# Altium footprint library TSC Footprints.PcbLib: 99 footprints (part 5 of 7)
Each footprint in its own frame and in the unit in brackets; x right, y up, seen from the top. Pads: shape width x height; smd on the part's side, far side on the other; paste and mask are expansions set on the pad; w line width, h text height; cw(c..) or ccw(c..) is an arc to the next point about the centre after c.
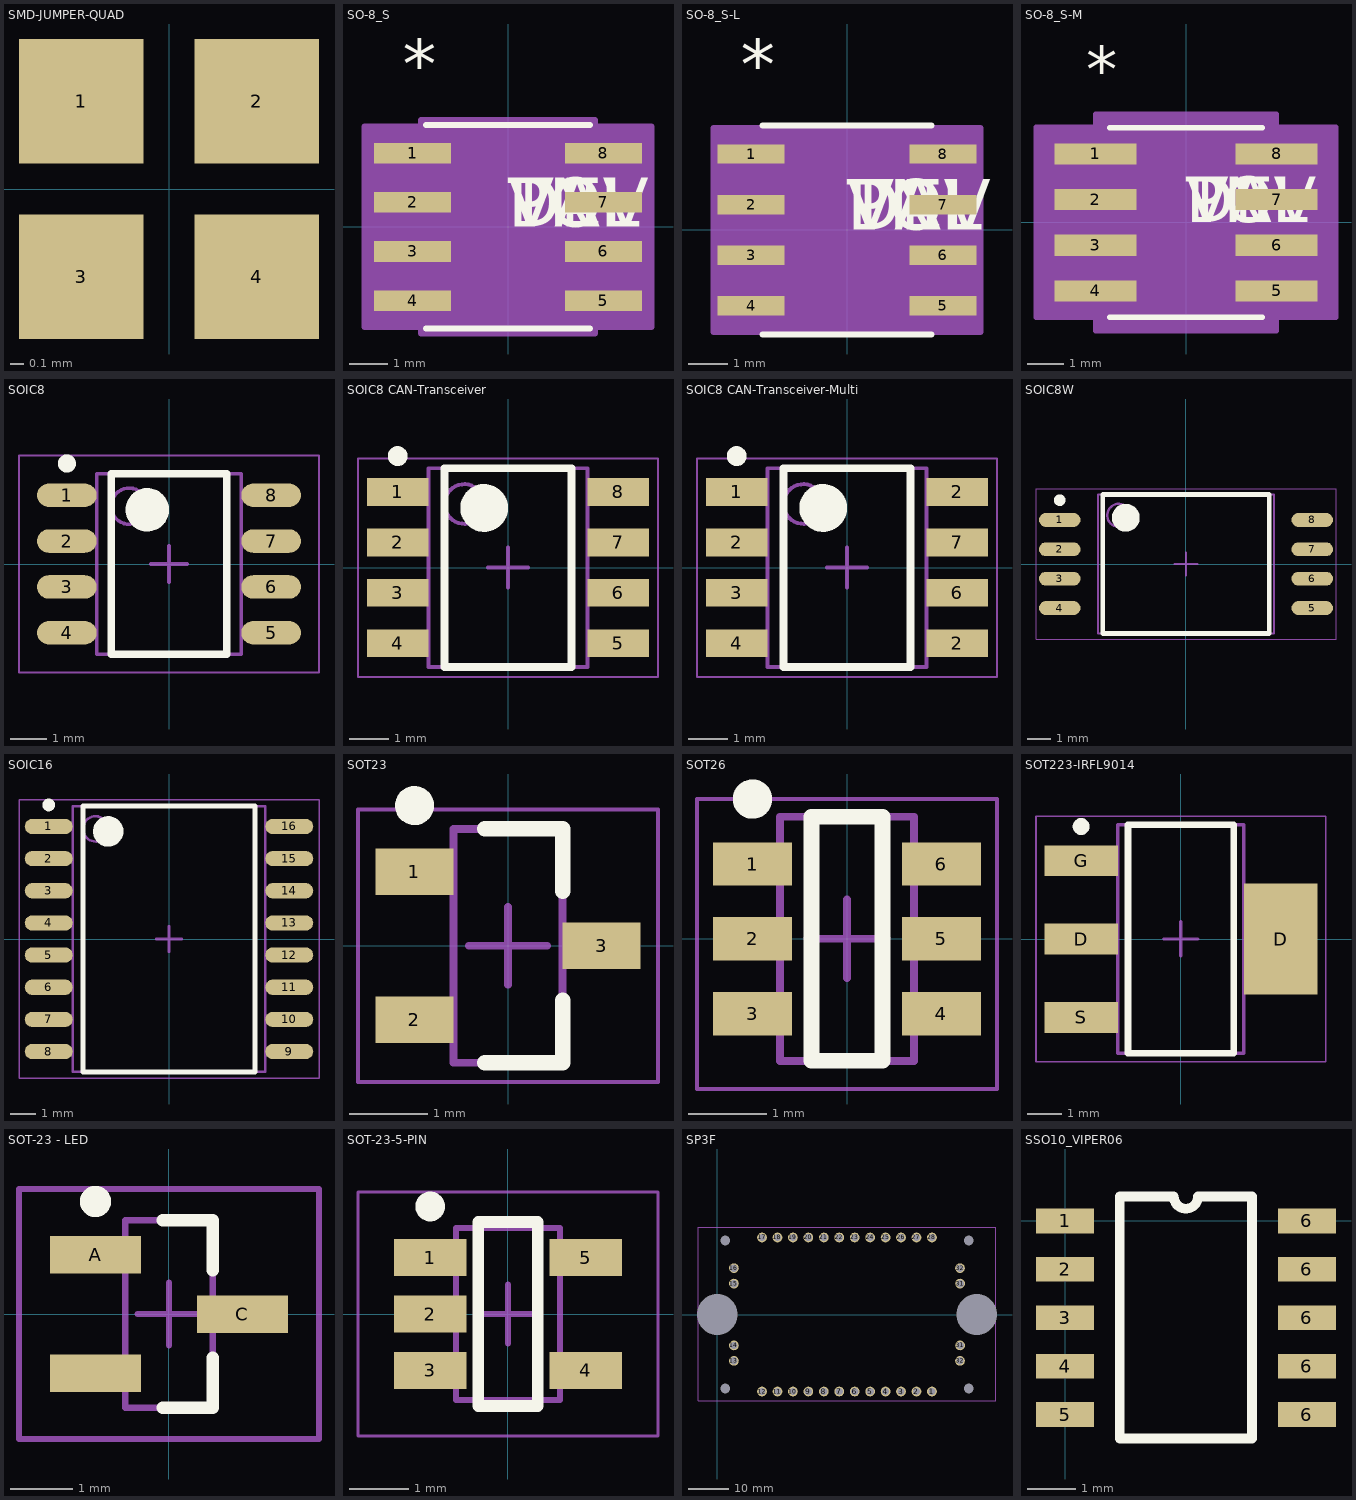
[diagram p4: the footprints below, top view; thin cyan lines are the x and y axes]

## SMD-JUMPER-QUAD [mm] "Jumper, SMD"
pads (4):
  rect 0.9x0.9 smd: 1(-0.635,0.635) 2(0.635,0.635) 3(-0.635,-0.635) 4(0.635,-0.635)

## SO-8_S [mil]
pads (8):
  rect 78x21 smd: 1(-97,75) 2(-97,25) 3(-97,-25) 4(-97,-75) 5(97,-75) 6(97,-25) 7(97,25) 8(97,75)
Top Overlay:
  lines w6: -83.5,-103.5 83.5,-103.5 ; -83.5,103.5 83.5,103.5
  text "TOL" at 0,0 h50
  text "VAL" at 0,0 h50
  text "DEV" at 0,0 h50
  text "PN" at 0,0 h50
  text "*" at -107,141 h50
Mechanical 13:
  lines w0: -12,98.5 ccw(c0,98.5) 12,98.5
  text "RefDes2" at 0,0 h50
  text "*" at -63.5,95.5 h50
Mechanical 15:
  region: -88.5,-102 -146,-102 -146,102 -88.5,102 -88.5,108.5 88.5,108.5 88.5,102 146,102 146,-102 88.5,-102 88.5,-108.5 -88.5,-108.5
  lines w6: -146,-102 -88.5,-102 -88.5,-108.5 88.5,-108.5 88.5,-102 146,-102 146,102 88.5,102 88.5,108.5 -88.5,108.5 -88.5,102 -146,102 -146,-102
3D body: height 10, standoff 0, extent 0,0 10,10
3D body "SO-8_S.step": height 69.09, standoff 0, extent -122.01,-98.51 122,98.5

## SO-8_S-L [mil]
pads (8):
  rect 66x19 smd: 1(-95,75) 2(-95,25) 3(-95,-25) 4(-95,-75) 5(95,-75) 6(95,-25) 7(95,25) 8(95,75)
Top Overlay:
  lines w6: -83.5,-103.5 83.5,-103.5 ; -83.5,103.5 83.5,103.5
  text "*" at -105,139 h50
  text "PN" at 0,0 h50
  text "DEV" at 0,0 h50
  text "VAL" at 0,0 h50
  text "TOL" at 0,0 h50
Mechanical 13:
  lines w0: -12,98.5 ccw(c0,98.5) 12,98.5
  text "*" at -63.5,95.5 h50
  text "RefDes2" at 0,0 h50
Mechanical 15:
  region: -82.5,-100.8 -132,-100.8 -132,100.8 -82.5,100.8 -82.5,102.5 82.5,102.5 82.5,100.8 132,100.8 132,-100.8 82.5,-100.8 82.5,-102.5 -82.5,-102.5
  lines w6: -132,-100.8 -132,100.8 -82.5,100.8 -82.5,102.5 82.5,102.5 82.5,100.8 132,100.8 132,-100.8 82.5,-100.8 82.5,-102.5 -82.5,-102.5 -82.5,-100.8 -132,-100.8
3D body: height 10, standoff 0, extent 0,0 10,10
3D body "SO-8_S-L.step": height 69.09, standoff 0, extent -122.01,-98.51 122,98.5

## SO-8_S-M [mil]
pads (8):
  rect 90x23 smd: 1(-99,75) 2(-99,25) 3(-99,-25) 4(-99,-75) 5(99,-75) 6(99,-25) 7(99,25) 8(99,75)
Top Overlay:
  lines w6: -83.5,-103.5 83.5,-103.5 ; -83.5,103.5 83.5,103.5
  text "*" at -109,143 h50
  text "PN" at 0,0 h50
  text "DEV" at 0,0 h50
  text "VAL" at 0,0 h50
  text "TOL" at 0,0 h50
Mechanical 13:
  lines w0: -12,98.5 ccw(c0,98.5) 12,98.5
  text "*" at -63.5,95.5 h50
  text "RefDes2" at 0,0 h50
Mechanical 15:
  region: -98.5,-104 -164,-104 -164,104 -98.5,104 -98.5,118.5 98.5,118.5 98.5,104 164,104 164,-104 98.5,-104 98.5,-118.5 -98.5,-118.5
  lines w6: -164,-104 -164,104 -98.5,104 -98.5,118.5 98.5,118.5 98.5,104 164,104 164,-104 98.5,-104 98.5,-118.5 -98.5,-118.5 -98.5,-104 -164,-104
3D body: height 10, standoff 0, extent 0,0 10,10
3D body "SO-8_S-M.step": height 69.09, standoff 0, extent -122.01,-98.51 122,98.5

## SOIC8 [mm] "SOIC, 8-Leads, Body 4,90x3,90mm, Pitch 1,27mm, IPC Low Density"
height 1.75
pads (8):
  oval 1.65x0.65 smd: 1(-2.825,1.905) 2(-2.825,0.635) 3(-2.825,-0.635) 4(-2.825,-1.905) 5(2.825,-1.905) 6(2.825,-0.635) 7(2.825,0.635) 8(2.825,1.905)
Top Overlay:
  circle w0.25: c-2.825,2.78 r0.125
  circle w0.6: c-0.6,1.5 r0.3
  lines w0.2: -1.6,-2.5 -1.6,2.5 1.6,2.5 1.6,-2.5 -1.6,-2.5
Mechanical 13:
  circle w0.1: c-1.1,1.6 r0.5
  lines w0.1: -2,-2.5 -2,2.5 2,2.5 2,-2.5 -2,-2.5
Mechanical 15:
  lines w0.05: -4.15,-3 -4.15,3 4.15,3 4.15,-3 -4.15,-3
  lines w0.1: -0.5,0 0.5,0 ; 0,-0.5 0,0.5
3D body "SOIC8.step": height 1.75, standoff 0, extent -3,-2.5 3,2.5

## SOIC8 CAN-Transceiver [mm] "SOIC, 8-Leads, Body 4,90x4,00mm, Pitch 1,27mm, IPC Medium Density"
height 1.75
pads (8):
  rect 1.55x0.7 smd: 1(-2.775,1.905) 2(-2.775,0.635) 3(-2.775,-0.635) 4(-2.775,-1.905) 5(2.775,-1.905) 6(2.775,-0.635) 7(2.775,0.635) 8(2.775,1.905)
Top Overlay:
  circle w0.25: c-2.775,2.805 r0.125
  circle w0.6: c-0.6,1.5 r0.3
  lines w0.2: -1.6,-2.5 -1.6,2.5 1.6,2.5 1.6,-2.5 -1.6,-2.5
Mechanical 13:
  circle w0.1: c-1.1,1.6 r0.5
  lines w0.1: -2,-2.5 -2,2.5 2,2.5 2,-2.5 -2,-2.5
Mechanical 15:
  lines w0.05: -3.775,-2.75 -3.775,2.75 3.775,2.75 3.775,-2.75 -3.775,-2.75
  lines w0.1: -0.5,0 0.5,0 ; 0,-0.5 0,0.5
3D body "SOIC8 CAN-Transciever.step": height 1.75, standoff 0, extent -3.1,-2.5 3.1,2.5

## SOIC8 CAN-Transceiver-Multi [mm] "SOIC, 8-Leads, Body 4,90x4,00mm, Pitch 1,27mm, IPC Medium Density"
height 1.75
pads (8):
  rect 1.55x0.7 smd: 1(-2.775,1.905) 2(-2.775,0.635) 2(2.775,-1.905) 2(2.775,1.905) 3(-2.775,-0.635) 4(-2.775,-1.905) 6(2.775,-0.635) 7(2.775,0.635)
Top Overlay:
  circle w0.6: c-0.6,1.5 r0.3
  circle w0.25: c-2.775,2.805 r0.125
  lines w0.2: -1.6,-2.5 1.6,-2.5 1.6,2.5 -1.6,2.5 -1.6,-2.5
Mechanical 13:
  circle w0.1: c-1.1,1.6 r0.5
  lines w0.1: -2,-2.5 2,-2.5 2,2.5 -2,2.5 -2,-2.5
Mechanical 15:
  lines w0.05: -3.775,-2.75 3.775,-2.75 3.775,2.75 -3.775,2.75 -3.775,-2.75
  lines w0.1: -0.5,0 0.5,0 ; 0,-0.5 0,0.5
3D body "SOIC8 CAN-Transciever.step": height 1.75, standoff 0, extent -3.1,-2.5 3.1,2.5

## SOIC8W [mm] "SOIC, 8-Leads, Body 5,85mm x 7,50mm, Pitch 1,27mm, IPC Medium Density"
height 2.8
pads (8):
  oval 1.8x0.6 smd: 1(-5.45,1.905) 2(-5.45,0.635) 3(-5.45,-0.635) 4(-5.45,-1.905) 5(5.45,-1.905) 6(5.45,-0.635) 7(5.45,0.635) 8(5.45,1.905)
Top Overlay:
  circle w0.6: c-2.6,2 r0.3
  circle w0.25: c-5.45,2.755 r0.125
  lines w0.2: -3.6,-3 3.6,-3 3.6,3 -3.6,3 -3.6,-3
Mechanical 13:
  circle w0.1: c-2.9,2.1 r0.5
  lines w0.1: -3.8,-3 3.8,-3 3.8,3 -3.8,3 -3.8,-3
Mechanical 15:
  lines w0.05: -6.475,-3.25 6.475,-3.25 6.475,3.25 -6.475,3.25 -6.475,-3.25
  lines w0.1: -0.5,0 0.5,0 ; 0,-0.5 0,0.5
3D body "SOIC8W.step": height 2.8, standoff 0, extent -5.75,-3 5.75,3

## SOIC16 [mm] "SOIC, 16-Leads, Body 10,30x7,50mm, Pitch 1,27mm, IPC Medium Density"
height 2.65
pads (16):
  oval 1.9x0.6 smd: 1(-4.75,4.445) 2(-4.75,3.175) 3(-4.75,1.905) 4(-4.75,0.635) 5(-4.75,-0.635) 6(-4.75,-1.905) 7(-4.75,-3.175) 8(-4.75,-4.445) 9(4.75,-4.445) 10(4.75,-3.175) 11(4.75,-1.905) 12(4.75,-0.635) 13(4.75,0.635) 14(4.75,1.905) 15(4.75,3.175) 16(4.75,4.445)
Top Overlay:
  circle w0.6: c-2.4,4.25 r0.3
  circle w0.25: c-4.75,5.295 r0.125
  lines w0.2: -3.4,-5.25 3.4,-5.25 3.4,5.25 -3.4,5.25 -3.4,-5.25
Mechanical 13:
  circle w0.1: c-2.9,4.35 r0.5
  lines w0.1: -3.8,-5.25 3.8,-5.25 3.8,5.25 -3.8,5.25 -3.8,-5.25
Mechanical 15:
  lines w0.05: -5.925,-5.5 5.925,-5.5 5.925,5.5 -5.925,5.5 -5.925,-5.5
  lines w0.1: -0.5,0 0.5,0 ; 0,-0.5 0,0.5
3D body "SOIC16.step": height 2.65, standoff 0, extent -5.162,-5.25 5.162,5.25

## SOT23 [mm] "SOT23, 3-Leads, Body 2,90x2,45mm, Pitch 0,95mm, IPC Medium Density"
height 1.1
pads (3):
  rect 1x0.6 smd: 1(-1.2,0.95) 2(-1.2,-0.95) 3(1.2,0)
Top Overlay:
  circle w0.25: c-1.2,1.8 r0.125
  lines w0.2: -0.3,-1.5 0.7,-1.5 0.7,-0.7 ; -0.3,1.5 0.7,1.5 0.7,0.7
Mechanical 13:
  lines w0.1: -0.7,-1.5 -0.7,1.5 0.7,1.5 0.7,-1.5 -0.7,-1.5
Mechanical 15:
  lines w0.05: -1.925,-1.75 -1.925,1.75 1.925,1.75 1.925,-1.75 -1.925,-1.75
  lines w0.1: -0.5,0 0.5,0 ; 0,-0.5 0,0.5
3D body "SOT23.step": height 1.1, standoff 0, extent -1.3,-1.5 1.3,1.5

## SOT26 [mm] "SOT26 ZXGD3006E6"
height 1.4
pads (6):
  rect 1x0.55 smd: 1(-1.2,0.95) 2(-1.2,0) 3(-1.2,-0.95) 4(1.2,-0.95) 5(1.2,0) 6(1.2,0.95)
Top Overlay:
  circle w0.25: c-1.2,1.775 r0.125
  lines w0.2: -0.45,-1.55 -0.45,1.55 0.45,1.55 0.45,-1.55 -0.45,-1.55
Mechanical 13:
  lines w0.1: -0.85,-1.55 0.85,-1.55 0.85,1.55 -0.85,1.55 -0.85,-1.55
Mechanical 15:
  lines w0.05: -1.905,-1.905 1.905,-1.905 1.905,1.778 -1.905,1.778 -1.905,-1.905
  lines w0.1: -0.5,0 0.5,0 ; 0,-0.5 0,0.5
3D body "SOT26.step": height 1.4, standoff 0, extent -1.5,-1.55 1.5,1.55

## SOT223-IRFL9014 [mm] "SOT223, 4-Leads, Body 6,50x7,00mm (avg), Pitch 2,30mm, IPC Medium Density"
height 1.8
pads (4):
  rect 2.15x0.9 smd: D(-2.925,0) G(-2.925,2.3) S(-2.925,-2.3)
  rect 2.15x3.25 smd: D(2.925,0)
Top Overlay:
  circle w0.25: c-2.925,3.3 r0.125
  lines w0.2: -1.55,-3.35 1.55,-3.35 1.55,3.35 -1.55,3.35 -1.55,-3.35
Mechanical 13:
  lines w0.1: -1.85,-3.35 1.85,-3.35 1.85,3.35 -1.85,3.35 -1.85,-3.35
Mechanical 15:
  lines w0.05: -4.25,-3.6 4.25,-3.6 4.25,3.6 -4.25,3.6 -4.25,-3.6
  lines w0.1: -0.5,0 0.5,0 ; 0,-0.5 0,0.5
3D body "SOT223-IRFL9014.step": height 1.8, standoff 0, extent -3.5,-3.35 3.5,3.35

## SOT-23 - LED [mm]
height 1.1
pads (3):
  rect 1.45x0.6 smd: A(-1.175,0.95) C(1.175,0) ""(-1.175,-0.95)
Top Overlay:
  circle w0.25: c-1.175,1.8 r0.125
  lines w0.2: -0.1,-1.5 0.7,-1.5 0.7,-0.7 ; -0.1,1.5 0.7,1.5 0.7,0.7
Mechanical 13:
  lines w0.1: -0.7,-1.5 0.7,-1.5 0.7,1.5 -0.7,1.5 -0.7,-1.5
Mechanical 15:
  lines w0.1: -0.5,0 0.5,0 ; 0,-0.5 0,0.5 ; -2.4,-2 2.4,-2 2.4,2 -2.4,2 -2.4,-2
3D body: height 1.1, standoff 0, extent -0.7,-1.5 0.7,1.5

## SOT-23-5-PIN [mm]
height 1
pads (5):
  rect 1.22x0.62 smd: 1(-1.31,0.95) 2(-1.31,0) 3(-1.31,-0.95) 4(1.31,-0.95) 5(1.31,0.95)
Top Overlay:
  circle w0.25: c-1.31,1.81 r0.125
  lines w0.2: -0.5,-1.55 0.5,-1.55 0.5,1.55 -0.5,1.55 -0.5,-1.55
Mechanical 13:
  lines w0.1: -0.875,-1.45 -0.875,1.45 0.875,1.45 0.875,-1.45 -0.875,-1.45
Mechanical 15:
  lines w0.05: -2.525,-2.05 -2.525,2.05 2.525,2.05 2.525,-2.05 -2.525,-2.05
  lines w0.1: -0.5,0 0.5,0 ; 0,-0.5 0,0.5
3D body "SOT-23-5-PIN.step": height 1, standoff 0, extent -1.45,-1.45 1.45,1.45

## SP3F [mm]
pads (38):
  round 2.4 hole 1.8: 1(52.95,-19) 2(49.14,-19) 3(45.33,-19) 4(41.52,-19) 5(37.71,-19) 6(33.9,-19) 7(30.09,-19) 8(26.28,-19) 9(22.47,-19) 10(18.66,-19) 11(14.85,-19) 12(11.04,-19) 13(4.1,-11.43) 14(4.1,-7.62) 15(4.1,7.62) 16(4.1,11.43) 17(11.04,19) 18(14.85,19) 19(18.66,19) 20(22.47,19) 21(26.28,19) 22(30.09,19) 23(33.9,19) 24(37.71,19) 25(41.52,19) 26(45.33,19) 27(49.14,19) 28(52.95,19) 31(59.9,-7.62) 31(59.9,7.62) 32(59.875,-11.43) 32(59.875,11.43)
  round 0 hole 10 unplated: ""(0,0) ""(64,0)
  round 0 hole 2.4 unplated: ""(2,-18.25) ""(2,18.25) ""(62,-18.25) ""(62,18.25)
Bottom Overlay:
  text "28" at 51.359,14.732 h2
  text "17" at 9.576,15.189 h2
  text "12" at 9.652,-17.043 h2
  text "1" at 52.578,-16.993 h2
Mechanical 15:
  lines w0.254: -4.7,-21.25 68.7,-21.25 68.7,21.5 -4.7,21.5 -4.7,-21.25
3D body "SP3F.stp": height 12, standoff -5.8, extent -4.671,-21.069 68.671,21.319

## SSO10_VIPER06 [mm]
pads (10):
  rect 1.2x0.51 smd: 1(0,0) 2(0,-1) 3(0,-2) 4(0,-3) 5(0,-4) 6(5,-4) 6(5,-3) 6(5,-2) 6(5,-1) 6(5,0)
Top Overlay:
  lines w0.2: 1.133,-4.496 1.133,0.504 2.248,0.504 ccw(c2.498,0.504) 2.748,0.504 3.863,0.504 3.863,-4.496 1.133,-4.496
3D body: height 1.75, standoff 0.25, extent 0.686,-4.699 4.293,0.635